# Altium footprint library myPcbLib.PcbLib: 987 footprints (part 5 of 62)
Each footprint in its own frame and in the unit in brackets; x right, y up, seen from the top. Pads: shape width x height; smd on the part's side, far side on the other; paste and mask are expansions set on the pad; w line width, h text height; cw(c..) or ccw(c..) is an arc to the next point about the centre after c.
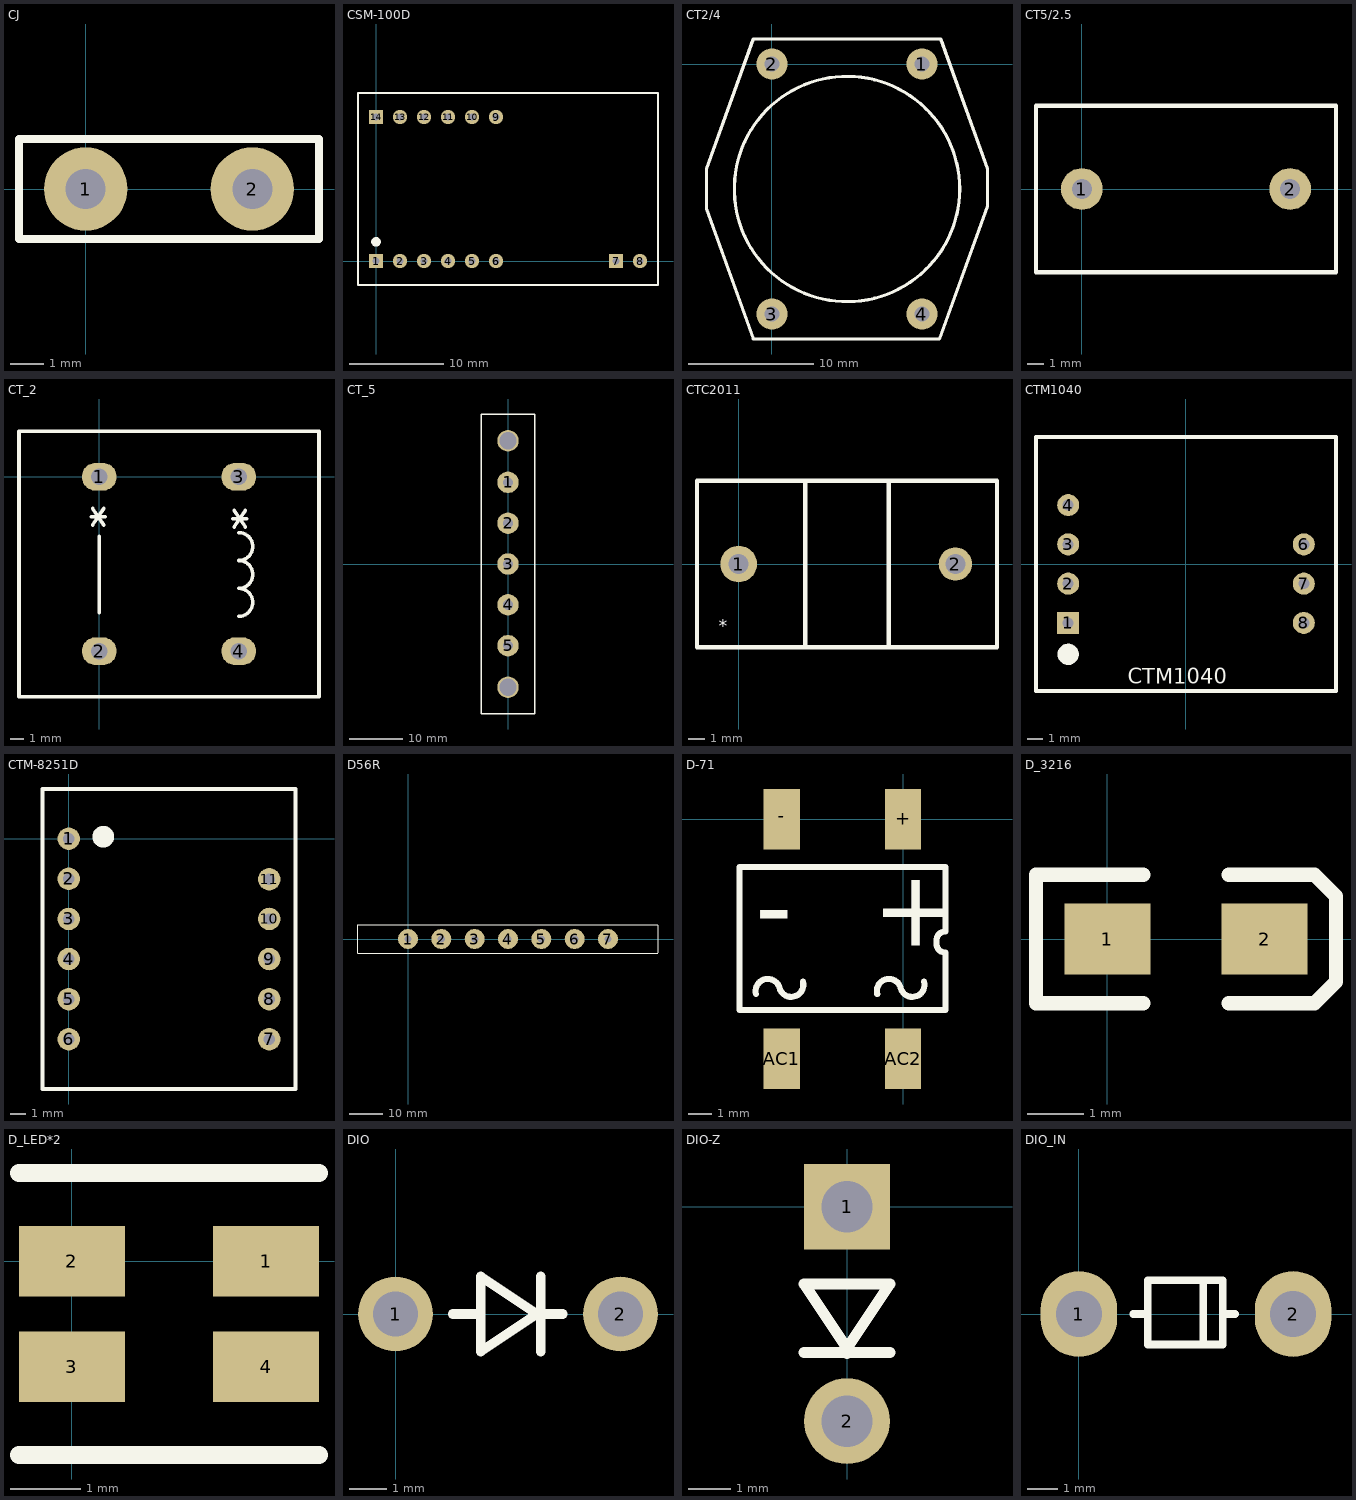
[diagram p4: the footprints below, top view; thin cyan lines are the x and y axes]

## CJ [mm] "CJ"
pads (2):
  round 2.5 hole 1.2: 1(0,0) 2(5,0)
Top Overlay:
  lines w0.254: -2,-1.5 7,-1.5 7,1.5 -2,1.5 -2,-1.5

## CSM-100D [mil]
pads (15):
  rect 60x60 hole 28: 1(0,0) 7(1000,0) 14(0,600)
  round 60 hole 28: 2(100,0) 3(200,0) 4(300,0) 5(400,0) 6(500,0) 6(500,0) 8(1100,0) 9(500,600) 10(400,600) 11(300,600) 12(200,600) 13(100,600)
Top Overlay:
  circle w20: c0,80 r10
  lines w10: -75,-100 1175,-100 1175,700 -75,700 -75,-100

## CT2/4 [mm]
pads (4):
  round 2.5 hole 1.2: 1(12,0) 2(0,0) 3(0,-20) 4(12,-20)
Top Overlay:
  circle w0.254: c6,-10 r9.014
  lines w0.254: -5.25,-11.596 -1.493,-22 13.41,-22 17.25,-11.365 17.25,-8.385 13.5,2 -1.5,2 -5.25,-8.385 -5.25,-11.596

## CT5/2.5 [mm]
pads (2):
  round 2.5 hole 1.2: 1(0,0) 2(12.5,0)
Top Overlay:
  lines w0.254: -2.75,0 -2.75,5 15.25,5 15.25,-0.25 15.25,-5 -2.75,-5 -2.75,0.25

## CT_2 [mm]
pads (4):
  oval 2.5x2 hole 1.2: 1(0,0) 2(0,-12.5) 3(10,0) 4(10,-12.5)
Top Overlay:
  lines w0.254: -0.577,-2.865 0.423,-2.865 ; -0.477,-3.465 0.323,-2.265 ; -0.477,-2.265 0.323,-3.465 ; 0,-9.75 0,-4.25 ; 9.566,-3 10.566,-3 ; 9.666,-3.6 10.466,-2.4 ; 9.666,-2.4 10.466,-3.6 ; 10,-10 ccw(c10,-9) 10,-8 ccw(c10,-7) 10,-6 ccw(c10,-5) 10,-4 ; -5.75,-15.75 15.75,-15.75 15.75,3.25 -5.75,3.25 -5.75,-15.75

## CT_5 [mm]
pads (7):
  round 4 hole 1.9: 1(0,15.24) 2(0,7.62) 3(0,0) 4(0,-7.62) 5(0,-15.24)
  round 4 hole 3.2: ""(0,-23) ""(0,23)
Top Overlay:
  lines w0.254: -5,-28 5,-28 5,28 -5,28 -5,-28

## CTC2011 [mm] "5A/2,5mA"
pads (2):
  round 2.2 hole 1.2: 1(0,0)
  round 2 hole 1.2: 2(13,0)
Top Overlay:
  lines w0.254: 4,-5 4,5 ; 9,-5 9,5 ; -2.5,-5 -2.5,5 15.5,5 15.5,-5 -2.5,-5
  text "*" at -1.2,-4.1 h0.76

## CTM1040 [mil]
height 236.22
pads (7):
  rect 56x56 hole 28: 1(-300,-150)
  round 56 hole 28: 2(-300,-50) 3(-300,50) 4(-300,150) 6(300,50) 7(300,-50) 8(300,-150)
Top Overlay:
  circle w30: c-300,-230 r12
  lines w10: -382,-323 -382,323 382,323 382,-323 -382,-323
  text "CTM1040" at -148.43,-304.33 h39.37

## CTM-8251D [mil]
pads (11):
  round 56 hole 28: 1(0,0) 2(0,-100) 3(0,-200) 4(0,-300) 5(0,-400) 6(0,-500) 7(500,-500) 8(500,-400) 9(500,-300) 10(500,-200) 11(500,-101)
Top Overlay:
  circle w30: c86,5 r12
  lines w10: -65,-624.04 -65,124.02 565,124.02 565,-624.02 -64.98,-624.02 -65,-624.04

## D56R [mm]
height 10
pads (7):
  round 6 hole 2.2: 1(0,0) 2(10,0) 3(20,0) 4(30,0) 5(40,0) 6(50,0) 7(60,0)
Top Overlay:
  lines w0.254: 74.93,-4.2 -15,-4.2 -15,4.2 74.93,4.2 ; 75,-4.168 75,4.2

## D-71 [mil]
pads (4):
  rect 60x100 smd: +(0,0) -(-200,0) AC1(-200,-395) AC2(0,-395)
Top Overlay:
  lines w10: -242.57,-288.54 cw(c-223.26,-283.37) -203.94,-278.19 ccw(c-184.62,-273.01) -165.3,-267.84 ; -42.57,-288.54 cw(c-23.26,-283.37) -3.94,-278.19 ccw(c15.38,-273.01) 34.7,-267.84 ; -270,-314.96 -270,-78.74 70,-78.74 70,-185 ccw(c70,-200) 55,-200 55,-205 ccw(c70,-205) 70,-220 70,-314.96 -270,-314.96
  text "+" at -51.18,-208.66 h125
  text "-" at -244.09,-204.72 h125

## D_3216 [mil]
pads (2):
  rect 60x50 smd: 1(0,0) 2(110,0)
Top Overlay:
  lines w10: 25,-45 -50,-45 -50,45 25,45 ; 85,-45 145,-45 160,-30 160,30 145,45 85,45

## D_LED*2 [mm]
pads (4):
  rect 1.5x1 smd: 1(2.75,0) 2(0,0) 3(0,-1.5) 4(2.75,-1.5)
Top Overlay:
  lines w0.254: -0.75,-2.75 3.5,-2.75 ; -0.75,1.25 3.5,1.25

## DIO [mm]
pads (2):
  round 2 hole 1.2: 1(0,0) 2(6,0)
Top Overlay:
  lines w0.254: 1.523,0 2.273,0 ; 3.875,-1 3.875,1 ; 4.459,0 3.9,0 3.773,0 ; 3.773,0 2.273,1 2.273,-1 3.773,0

## DIO-Z [mm]
pads (2):
  rect 2x2 hole 1.2: 1(0,0)
  round 2 hole 1.2: 2(0,-5)
Top Overlay:
  lines w0.254: -1,-3.398 1,-3.398 ; 0,-3.424 0,-3.297 ; 0,-3.297 -1,-1.797 1,-1.797 0,-3.297

## DIO_IN [mm]
pads (2):
  oval 2.5x2.8 hole 1.5: 1(0,0) 2(7,0)
Top Overlay:
  lines w0.254: 1.778,0 2.25,0 ; 4.065,-1 4.065,1.1 ; 4.7,0 5.1,0 ; 2.25,-1 4.7,-1 4.7,1.1 2.25,1.1 2.25,-1